# Altium footprint library CeleronLib_THD.PcbLib: 217 footprints (part 5 of 14)
Each footprint in its own frame and in the unit in brackets; x right, y up, seen from the top. Pads: shape width x height; smd on the part's side, far side on the other; paste and mask are expansions set on the pad; w line width, h text height; cw(c..) or ccw(c..) is an arc to the next point about the centre after c.
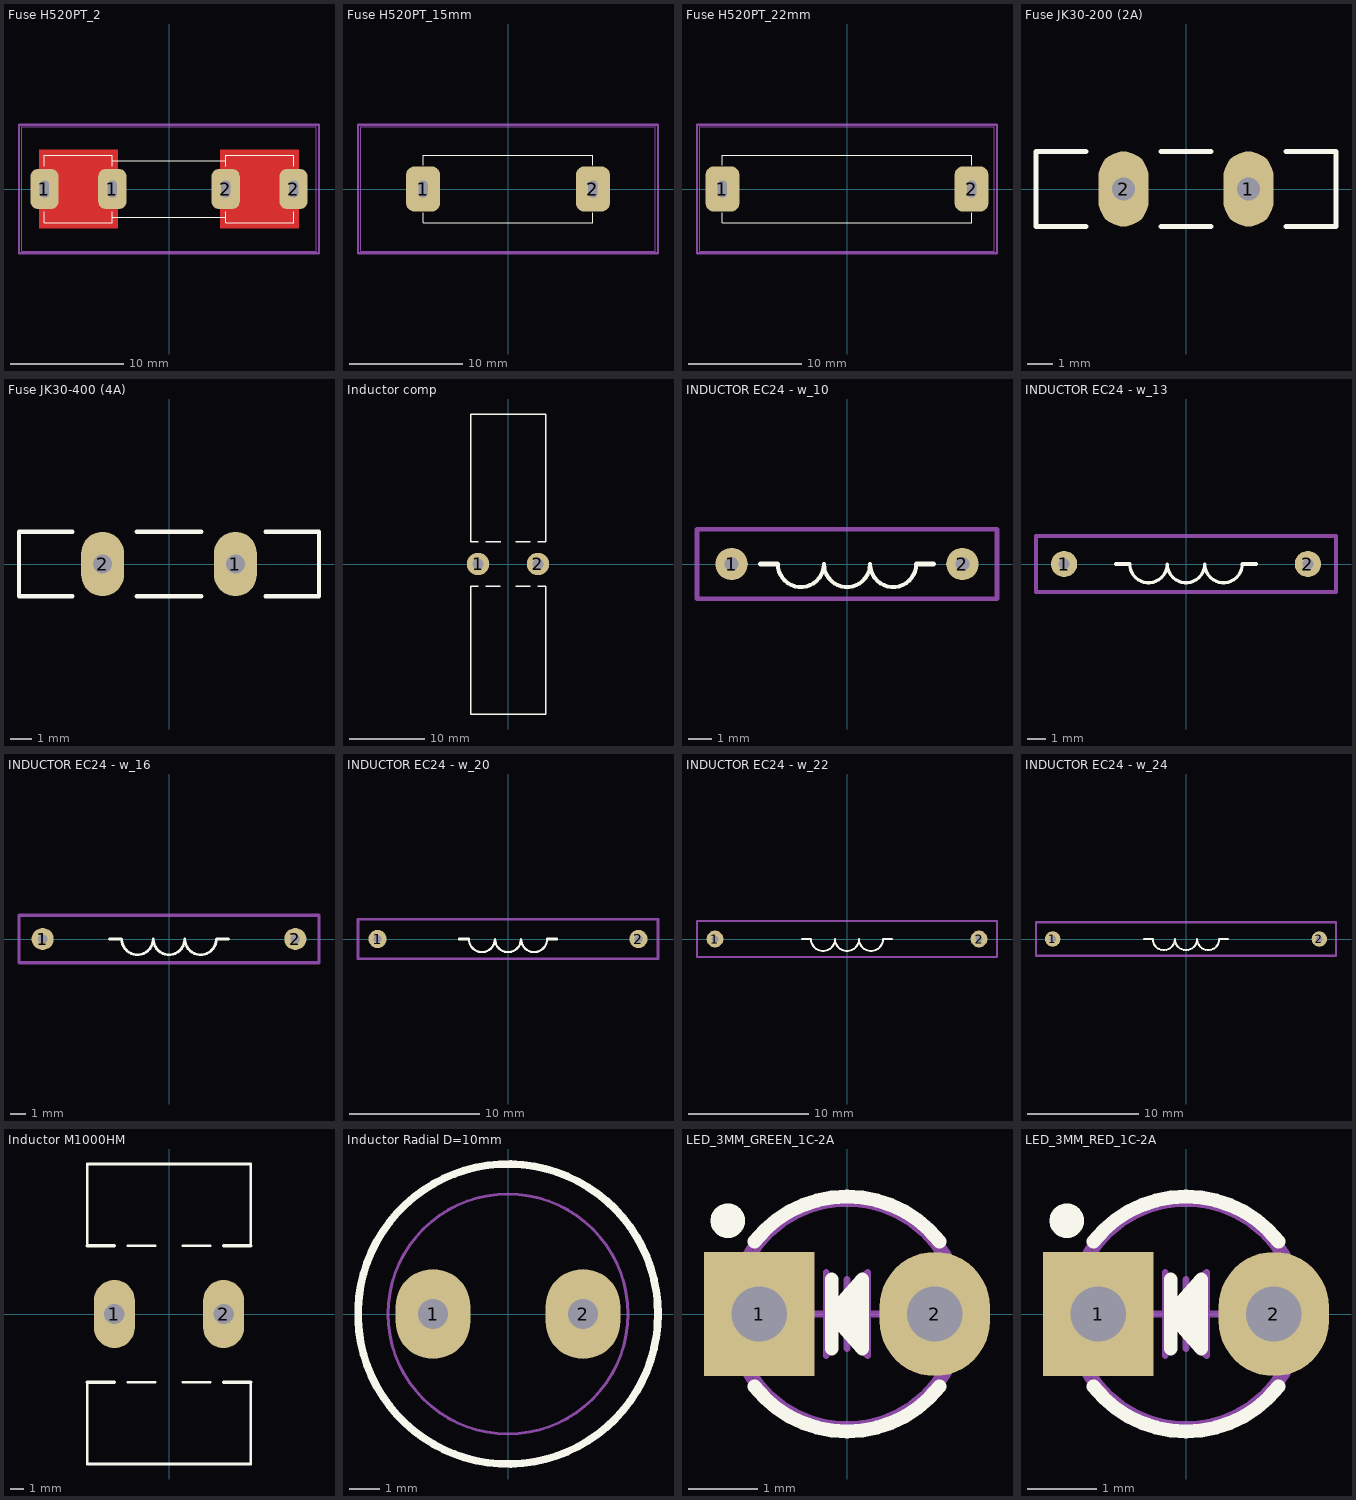
[diagram p4: the footprints below, top view; thin cyan lines are the x and y axes]

## Fuse H520PT_2 [mm] "Держатель предохранителя 5x20 mm - по два контакта с каждой стороны, интервал внешних 22мм, интервал внутренних 10мм (или пара \"одиночных скоб на плату\")"
height 15
pads (4):
  rrect50% 2.5x3.5 hole 0.8 slot 1.5 at 90 deg: 1(-11,0) 1(-5,0) 2(5,0) 2(11,0)
Top Layer:
  rectangle: -11.5,-3.5 -4.5,3.5
  rectangle: 4.5,-3.5 11.5,3.5
Top Overlay:
  lines w0.1: -11,-2 -11,-3 -5,-3 -5,-2 ; -11,2 -11,3 -5,3 -5,2 ; -5,-2.5 5,-2.5 ; -5,2.5 5,2.5 ; 5,-2 5,-3 11,-3 11,-2 ; 5,2 5,3 11,3 11,2
Top 3D:
  circle w0.1: c-11,0 r0.4
  circle w0.1: c-5,0 r0.4
  circle w0.1: c5,0 r0.4
  circle w0.1: c11,0 r0.4
  lines w0.1: -13,-5.5 -13,5.5 13,5.5 13,-5.5 -13,-5.5
Top Courtyard:
  lines w0.2: -13.25,-5.665 -13.25,5.665 13.25,5.665 13.25,-5.665 -13.25,-5.665
3D body: height 0.2, standoff -3.5, extent 10.593,-0.407 11.407,0.407
3D body: height 0.2, standoff -3.5, extent 4.593,-0.407 5.407,0.407
3D body: height 0.2, standoff -3.5, extent -5.407,-0.407 -4.593,0.407
3D body: height 0.2, standoff -3.5, extent -11.407,-0.407 -10.593,0.407
3D body: height 14, standoff 0.2, extent -12.999,-5.499 12.999,5.499

## Fuse H520PT_15mm [mm] "Держатель предохранителя 5x20 mm - по одному контакту с каждой стороны, с интервалом 15mm (закрытый)"
height 15
pads (2):
  rrect50% 3x4 hole 0.8 slot 1.5 at 90 deg: 1(-7.5,0) 2(7.5,0)
Top Overlay:
  lines w0.1: -7.5,-2.1 -7.5,-3 -5,-3 5,-3 7.5,-3 7.5,-2.1 ; -7.5,2.1 -7.5,3 -5,3 5,3 7.5,3 7.5,2.1
Top 3D:
  circle w0.1: c7.5,0 r0.4
  circle w0.1: c-7.5,0 r0.4
  lines w0.1: -13,-5.5 13,-5.5 13,5.5 -13,5.5 -13,-5.5
Top Courtyard:
  lines w0.2: -13.25,-5.665 -13.25,5.665 13.25,5.665 13.25,-5.665 -13.25,-5.665
3D body: height 14, standoff 0.2, extent -12.999,-5.499 12.999,5.499
3D body: height 0.2, standoff -3.5, extent -7.907,-0.407 -7.093,0.407
3D body: height 0.2, standoff -3.5, extent 7.093,-0.407 7.907,0.407

## Fuse H520PT_22mm [mm] "Держатель предохранителя 5x20 mm - по одному контакту с каждой стороны, с интервалом 22mm (или \"предохранитель с выводами\" без держателя)"
height 15
pads (2):
  rrect50% 3x4 hole 0.8 slot 1.5 at 90 deg: 1(-11,0) 2(11,0)
Top Overlay:
  lines w0.1: -11,-2.1 -11,-3 -5,-3 5,-3 11,-3 11,-2.1 ; -11,2.1 -11,3 -5,3 5,3 11,3 11,2.1
Top 3D:
  circle w0.1: c-11,0 r0.4
  circle w0.1: c11,0 r0.4
  lines w0.1: -13,-5.5 -13,5.5 13,5.5 13,-5.5 -13,-5.5
Top Courtyard:
  lines w0.2: -13.25,-5.665 13.25,-5.665 13.25,5.665 -13.25,5.665 -13.25,-5.665
3D body: height 0.2, standoff -3.5, extent 10.593,-0.407 11.407,0.407
3D body: height 0.2, standoff -3.5, extent -11.407,-0.407 -10.593,0.407
3D body: height 14, standoff 0.2, extent -12.999,-5.499 12.999,5.499

## Fuse JK30-200 (2A) [mm] "Самовосстанавливающийся предохранитель 2A"
pads (2):
  oval 2x3 hole 0.9: 1(2.5,0) 2(-2.5,0)
Top Overlay:
  lines w0.2: -4,-1.5 -6,-1.5 -6,1.5 -4,1.5 ; -1,-1.5 1,-1.5 ; -1,1.5 1,1.5 ; 4,-1.5 6,-1.5 6,1.5 4,1.5

## Fuse JK30-400 (4A) [mm] "Самовосстанавливающийся предохранитель 4A"
pads (2):
  oval 2x3 hole 0.9: 1(3.1,0) 2(-3.1,0)
Top Overlay:
  lines w0.2: -4.5,-1.5 -7,-1.5 -7,1.5 -4.5,1.5 ; -1.5,-1.5 1.5,-1.5 ; -1.5,1.5 1.5,1.5 ; 4.5,-1.5 7,-1.5 7,1.5 4.5,1.5

## Inductor comp [mm] "Индуктивность компьютерная. D=20mm, h=9mm, шаг=8мм, d=1.3mm"
pads (2):
  round 3 hole 1.5: 1(-4,0) 2(4,0)
Top Overlay:
  lines w0.2: -4,-3 -5,-3 -5,-20 5,-20 5,-3 4,-3 ; -4,3 -5,3 -5,20 5,20 5,3 4,3 ; -3,-3 -1,-3 ; -3,3 -1,3 ; 1,-3 3,-3 ; 1,3 3,3

## INDUCTOR EC24 - w_10 [mm] "Индуктивность, L=10mm"
height 3
pads (2):
  round 1.4 hole 0.6: 1(-5,0) 2(5,0)
Top Overlay:
  lines w0.178: -3,0 ccw(c-2,0) -1,0 ccw(c0,0) 1,0 ccw(c2,0) 3,0
  lines w0.2: -3.75,0 -3,0 ; 3,0 3.75,0
Top Courtyard:
  lines w0.2: -6.5,-1.5 6.5,-1.5 6.5,1.5 -6.5,1.5 -6.5,-1.5

## INDUCTOR EC24 - w_13 [mm] "Индуктивность, L=13mm"
height 3
pads (2):
  round 1.4 hole 0.6: 1(-6.5,0) 2(6.5,0)
Top Overlay:
  lines w0.178: -3,0 ccw(c-2,0) -1,0 ccw(c0,0) 1,0 ccw(c2,0) 3,0
  lines w0.2: -3.75,0 -3,0 ; 3,0 3.75,0
Top Courtyard:
  lines w0.2: -8,-1.5 8,-1.5 8,1.5 -8,1.5 -8,-1.5

## INDUCTOR EC24 - w_16 [mm] "Индуктивность, L=16mm"
height 3
pads (2):
  round 1.4 hole 0.6: 1(-8,0) 2(8,0)
Top Overlay:
  lines w0.178: -3,0 ccw(c-2,0) -1,0 ccw(c0,0) 1,0 ccw(c2,0) 3,0
  lines w0.2: -3.75,0 -3,0 ; 3,0 3.75,0
Top Courtyard:
  lines w0.2: -9.5,-1.5 9.5,-1.5 9.5,1.5 -9.5,1.5 -9.5,-1.5

## INDUCTOR EC24 - w_20 [mm] "Индуктивность, L=20mm"
height 3
pads (2):
  round 1.4 hole 0.6: 1(-10,0) 2(10,0)
Top Overlay:
  lines w0.178: -3,0 ccw(c-2,0) -1,0 ccw(c0,0) 1,0 ccw(c2,0) 3,0
  lines w0.2: -3.75,0 -3,0 ; 3,0 3.75,0
Top Courtyard:
  lines w0.2: -11.5,-1.5 -11.5,1.5 11.5,1.5 11.5,-1.5 -11.5,-1.5

## INDUCTOR EC24 - w_22 [mm] "Индуктивность, L=22mm"
height 3
pads (2):
  round 1.4 hole 0.6: 1(-11,0) 2(11,0)
Top Overlay:
  lines w0.178: -3,0 ccw(c-2,0) -1,0 ccw(c0,0) 1,0 ccw(c2,0) 3,0
  lines w0.2: -3.75,0 -3,0 ; 3,0 3.75,0
Top Courtyard:
  lines w0.2: -12.5,-1.5 12.5,-1.5 12.5,1.5 -12.5,1.5 -12.5,-1.5

## INDUCTOR EC24 - w_24 [mm] "Индуктивность, L=24mm"
height 3
pads (2):
  round 1.4 hole 0.6: 1(-12,0) 2(12,0)
Top Overlay:
  lines w0.178: -3,0 ccw(c-2,0) -1,0 ccw(c0,0) 1,0 ccw(c2,0) 3,0
  lines w0.2: -3.75,0 -3,0 ; 3,0 3.75,0
Top Courtyard:
  lines w0.2: -13.5,-1.5 13.5,-1.5 13.5,1.5 -13.5,1.5 -13.5,-1.5

## Inductor M1000HM [mm] "Индуктивность. D=20mm, h=22mm, шаг=8мм, d=1.4mm"
height 22
pads (2):
  oval 3x5 hole 1.5: 1(-4,0) 2(4,0)
Top Overlay:
  lines w0.2: -6,-5 -6,-11 6,-11 6,-5 ; -6,5 -6,11 6,11 6,5 ; -3,-5 -1,-5 ; -3,5 -1,5 ; 1,-5 3,-5 ; 1,5 3,5
  lines w0.254: -6,-5 -4,-5 ; -6,5 -4,5 ; 4,-5 6,-5 ; 4,5 6,5

## Inductor Radial D=10mm [mm] "Индуктивность Sumida RCH-895 (D=10mm, Step=5mm)"
height 12
pads (2):
  oval 2.5x3 hole 1: 1(-2.5,0) 2(2.5,0)
Top Overlay:
  circle w0.254: c0,0 r5
Top 3D:
  circle w0.1: c0,0 r4
3D body: height 12, standoff 9, extent -5.01,-5.01 5.01,5.01
3D body: height 3, standoff 0, extent -5.01,-5.01 5.01,5.01
3D body: height 12, standoff 0, extent -4.012,-4.012 4.012,4.012

## LED_3MM_GREEN_1C-2A [mm] "LED, Green, Body Dia. 3.43 mm, Pin spacing 2.54mm"
height 6.35
pads (2):
  rect 1.6x1.8 hole 0.8: 1(-1.27,0)
  oval 1.6x1.8 hole 0.8: 2(1.27,0)
Top Overlay:
  circle w0.25: c-1.725,1.35 r0.125
  lines w0.2: -1.339,-1.048 ccw(c0,0) 1.339,-1.048 ; -1.339,1.048 cw(c0,0) 1.339,1.048 ; -0.22,-0.5 -0.22,0.5 ; 0.22,-0.4 -0.22,0 ; 0.22,-0.3 -0.22,0 ; 0.22,-0.2 -0.22,0 ; 0.22,-0.1 -0.22,0 ; 0.22,0 -0.22,0 ; 0.22,0.1 -0.22,0 ; 0.22,0.2 -0.22,0 ; 0.22,0.3 -0.22,0 ; 0.22,0.4 -0.22,0 ; -0.22,0 0.22,0.5 0.22,-0.5 -0.22,0
Mechanical 8:
  lines w0.1: -1.77,0 -1.27,0 ; -1.27,-0.5 -1.27,0 ; -1.27,0.5 -1.27,0 ; -0.77,0 -1.27,0 ; -0.5,0 0,0 ; 0,-0.5 0,0 ; 0,0.5 0,0 ; 0.5,0 0,0 ; 0.77,0 1.27,0 ; 1.27,-0.5 1.27,0 ; 1.27,0.5 1.27,0 ; 1.77,0 1.27,0
Top Assy:
  circle w0.1: c0,0 r1.7
  circle w0.1: c0,0 r1.6
  lines w0.1: -0.3,-0.6 -0.3,0.6 ; 0.3,0 -0.3,0 ; -0.3,0 0.3,0.6 0.3,-0.6 -0.3,0
3D body: height 9.85, standoff -3.5, extent -1.715,-1.715 1.715,1.715

## LED_3MM_RED_1C-2A [mm] "LED, Red, Body Dia. 3.43 mm, Pin spacing 2.54mm"
height 6.35
pads (2):
  rect 1.6x1.8 hole 0.8: 1(-1.27,0)
  oval 1.6x1.8 hole 0.8: 2(1.27,0)
Top Overlay:
  circle w0.25: c-1.725,1.35 r0.125
  lines w0.2: -1.339,-1.048 ccw(c0,0) 1.339,-1.048 ; -1.339,1.048 cw(c0,0) 1.339,1.048 ; -0.22,-0.5 -0.22,0.5 ; 0.22,-0.4 -0.22,0 ; 0.22,-0.3 -0.22,0 ; 0.22,-0.2 -0.22,0 ; 0.22,-0.1 -0.22,0 ; 0.22,0 -0.22,0 ; 0.22,0.1 -0.22,0 ; 0.22,0.2 -0.22,0 ; 0.22,0.3 -0.22,0 ; 0.22,0.4 -0.22,0 ; -0.22,0 0.22,-0.5 0.22,0.5 -0.22,0
Mechanical 8:
  lines w0.1: -1.77,0 -1.27,0 ; -1.27,-0.5 -1.27,0 ; -1.27,0.5 -1.27,0 ; -0.77,0 -1.27,0 ; -0.5,0 0,0 ; 0,-0.5 0,0 ; 0,0.5 0,0 ; 0.5,0 0,0 ; 0.77,0 1.27,0 ; 1.27,-0.5 1.27,0 ; 1.27,0.5 1.27,0 ; 1.77,0 1.27,0
Top Assy:
  circle w0.1: c0,0 r1.6
  circle w0.1: c0,0 r1.7
  lines w0.1: -0.3,-0.6 -0.3,0.6 ; 0.3,0 -0.3,0 ; -0.3,0 0.3,-0.6 0.3,0.6 -0.3,0
3D body: height 9.85, standoff -3.5, extent -1.715,-1.715 1.715,1.715